# Altium footprint library ALTİUM_PROJE.PcbLib1.PcbLib: 38 footprints (part 1 of 3)
Each footprint in its own frame and in the unit in brackets; x right, y up, seen from the top. Pads: shape width x height; smd on the part's side, far side on the other; paste and mask are expansions set on the pad; w line width, h text height; cw(c..) or ccw(c..) is an arc to the next point about the centre after c.
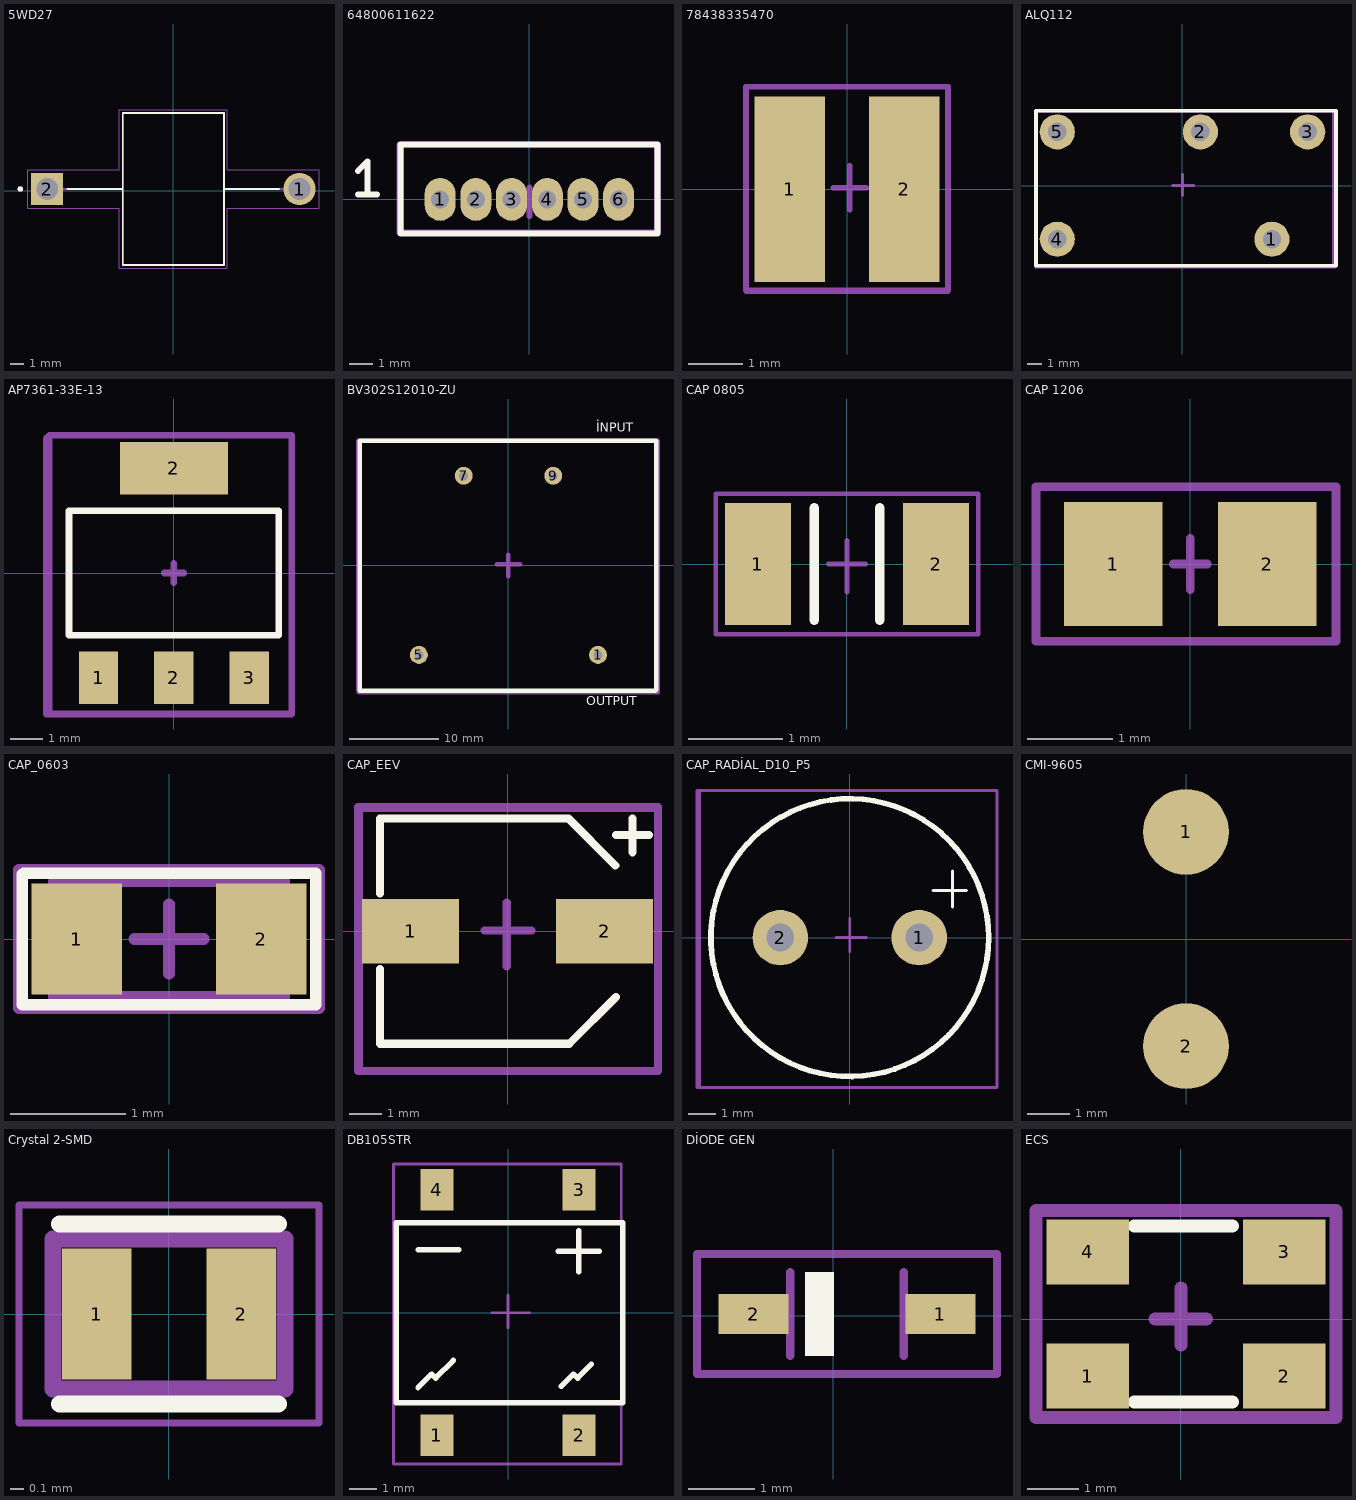
[diagram p0: the footprints below, top view; thin cyan lines are the x and y axes]

## 5WD27 [mm]
pads (2):
  round 2.43 hole 1.62 mask+0.05: 1(9.49,0.127)
  rect 2.43x2.43 hole 1.62: 2(-9.49,0.127)
Top Overlay:
  circle w0.2: c-11.5,0.127 r0.1
  lines w0.127: -7.96,0.127 -3.81,0.127 ; 7.96,0.127 3.81,0.127 ; -3.81,0.127 -3.81,5.847 3.81,5.847 3.81,0.127 ; -3.81,0.127 -3.81,-5.593 3.81,-5.593 3.81,0.127
Mechanical 13:
  circle w0.2: c-11.5,0.127 r0.1
  lines w0.127: -8.275,0.127 -3.81,0.127 ; 8.275,0.127 3.81,0.127 ; -3.81,0.127 -3.81,5.847 3.81,5.847 3.81,0.127 ; -3.81,0.127 -3.81,-5.593 3.81,-5.593 3.81,0.127
Mechanical 15:
  lines w0.05: -10.955,-1.338 -4.06,-1.338 -4.06,-5.843 4.06,-5.843 4.06,-1.338 10.955,-1.338 10.955,1.592 4.06,1.592 4.06,6.097 -4.06,6.097 -4.06,1.592 -10.955,1.592 -10.955,-1.338
3D body "step_temp.STEP": height 5.71, standoff -5.71, extent -31.242,-5.588 26.162,5.842

## 64800611622 [mm]
pads (6):
  oval 1.3x1.8 hole 0.75 mask+0.05: 1(-3.75,0) 2(-2.25,0) 3(-0.75,0) 4(0.75,0) 5(2.25,0) 6(3.75,0)
Top Overlay:
  lines w0.25: -7.2,0.2 -6.4,0.2 ; -7.2,1.2 -6.8,1.6 -6.8,0.2 ; 5.38,2.28 5.38,-1.43 -5.42,-1.43 -5.42,2.3 5.38,2.3
Top Component Center:
  lines w0.25: -0.5,0 0.5,0 ; 0,-0.7 0,0.5 ; -5.45,-1.4 -5.45,2.3 5.35,2.3 5.35,-1.4 -5.45,-1.4
Top Designator:
  lines w0.25: -5.4,-1.4 -5.4,2.3 5.4,2.3 5.4,-1.4 -5.4,-1.4
  text "DESİGNER" at -0.1,1 h1
3D body "64800611622 (rev1).stp": height 5.25, standoff -1.95, extent -5.27,-1.31 5.23,2.19

## 78438335470 [mm]
pads (2):
  rect 1.3x3.4 smd mask+0.05: 1(-1.05,0) 2(1.05,0)
Top Component Center:
  lines w0.1: -0.25,0.025 0.35,0.025 0.05,0.025 ; 0.05,-0.375 0.05,0.025 ; 0.05,0.425 0.05,0.025 ; -1.85,-1.875 -1.85,-0.938 -1.85,0.937 -1.85,1.875 1.85,1.875 1.85,0.937 1.85,-0.938 1.85,-1.875 -1.85,-1.875
Top Designator:
  lines w0.1: -1.854,1.88 -1.854,-1.854 1.854,-1.854 1.854,1.88 -1.829,1.88
  text "DESİGNER" at -0.3,0.6 h0.5
3D body "78438335010_Download_STP_WE-MAIA-3015_rev1.stp": height 1.2, standoff 0, extent -1.5,-1.5 1.5,1.5

## ALQ112 [mm]
pads (5):
  round 2.5 hole 1.3 mask+0.05: 1(6.35,-3.81) 2(1.27,3.81) 3(8.89,3.81) 4(-8.89,-3.81) 5(-8.89,3.81)
Top Overlay:
  lines w0.25: -10.4,-5.7 -10.4,5.3 10.9,5.3 10.9,-5.7 -10.4,-5.7
Top Component Center:
  lines w0.2: -0.7,0 0.8,0 ; 0,-0.7 0,0.8 ; -10.39,-5.79 -10.39,5.31 10.51,5.31 10.81,5.31 10.81,-5.79 -10.39,-5.79
Top Designator:
  lines w0.2: -10.4,-5.8 -10.4,5.3 10.7,5.3 10.7,-5.7 -10.3,-5.7 -10.4,-5.8
  text "DENGİNATOR" at 0.954,-0.046 h1
3D body: height 15.6, standoff 0.4, extent -10.39,-5.69 10.61,5.31
3D body: height 0.45, standoff -3.75, extent 6,-4.06 6.7,-3.56
3D body: height 0.45, standoff -3.75, extent 0.92,3.56 1.62,4.06
3D body: height 0.45, standoff -3.75, extent -9.29,-4.21 -8.49,-3.41
3D body: height 0.45, standoff -3.75, extent -9.29,3.41 -8.49,4.21
3D body: height 0.45, standoff -3.75, extent 8.54,3.56 9.24,4.06

## AP7361-33E-13 [mm]
pads (4):
  rect 1.2x1.6 smd mask+0.05: 1(-2.3,-3.2) 2(0,-3.2) 3(2.3,-3.2)
  rect 3.3x1.6 smd mask+0.05: 2(0,3.2)
Top Overlay:
  lines w0.2: -3.2,-1.9 -3.2,1.9 3.2,1.9 3.2,-1.9 -3.2,-1.9
Top Component Center:
  lines w0.2: -0.3,0 0.3,0 ; 0,-0.3 0,0.3 ; -3.8,-4.3 -3.8,4.2 3.6,4.2 3.6,-4.3 -3.8,-4.3
Top Designator:
  lines w0.2: -3.9,-4.3 -3.9,4.1 -3.8,4.2 3.6,4.2 3.6,-4.3 -3.9,-4.3
3D body "CircuitWorks-SOT-223.step": height 1.65, standoff -0.03, extent -3.25,-3.48 3.25,3.48

## BV302S12010-ZU [mm]
pads (4):
  round 2 hole 1 mask+0.05: 1(10,-10) 5(-10,-10) 7(-5,10) 9(5,10)
Top Overlay:
  lines w0.5: -16.6,-14 -16.6,13.9 16.5,13.9 16.5,-13.9 16.4,-14 -16.6,-14
  text "İNPUT" at 9.8,14.9 h1
  text "OUTPUT" at 8.7,-15.6 h1
Top Component Center:
  lines w0.5: -1.3,0.1 1.3,0.1 ; 0,-1.2 0,1.2 ; -16.8,-14 -16.8,13.9 16.6,13.9 16.6,-13.8 16.6,-14.1 -16.7,-14.1 -16.8,-14
Top Designator:
  lines w0.5: -16.7,-14.2 -16.7,13.8 -16.6,13.9 16.7,13.9 16.7,-14.2 -16.7,-14.2
3D body "User Library-Hahn BV EI 302 2902.SLDPRT": height 4.5, standoff -21.8, extent -16.15,-13.9 16.35,13.6

## CAP 0805 [mm]
pads (2):
  rect 0.7x1.3 smd mask+0.05: 1(-0.95,0) 2(0.95,0)
Top Overlay:
  lines w0.1: -0.35,-0.6 -0.35,0.6 ; 0.35,-0.6 0.35,0.6
Top Component Center:
  lines w0.05: -0.2,0 0.2,0 0,0 ; 0,-0.3 0,0.25 ; -1.4,-0.75 -1.4,0.75 -1.35,0.75 1.4,0.75 1.4,-0.75 -1.4,-0.75
Top Designator:
  lines w0.05: -1.4,-0.75 -1.4,0.75 1.4,0.75 1.4,-0.75 -1.4,-0.75
  text "DESİGNER" at -0.25,0.05 h0.5
3D body "CAPC0805.STEP": height 0.92, standoff 0.02, extent -1.301,-0.678 1.301,0.678

## CAP 1206 [mm]
pads (2):
  rect 1.15x1.45 smd mask+0.05: 1(-0.9,0) 2(0.9,0)
Top Component Center:
  lines w0.1: -0.2,0 0.2,0 0,0 0,0.3 0,-0.3 ; -1.8,-0.9 1.7,-0.9 1.7,0.9 -1.6,0.9 -1.8,0.9 -1.8,-0.9
Top Designator:
  lines w0.1: -1.8,-0.9 -1.8,0.9 1.7,0.9 1.7,-0.9 -1.8,-0.9
  text "DESİGNER" at -0.7,0 h1
3D body "CircuitWorks-CAPACITOR 1206.STEP": height 1.63, standoff -0.03, extent -1.605,-0.78 1.595,0.78

## CAP_0603 [mil]
pads (2):
  rect 31x38 smd mask+1.97: 1(-31.5,0) 2(31.5,0)
Top Overlay:
  lines w3.94: -50.04,22.02 -50.04,-22.48 50.04,-22.48 50.04,22.48 -49.58,22.48
Bottom 3D Body:
  lines w3.94: -39.37,-19.68 39.37,-19.68 39.37,19.68 -39.37,19.68 -39.37,-19.68
  text "DENGİNATOR" at 3.94,-7.87 h9.45
Top Component Center:
  lines w3.94: -11.81,0 11.81,0 ; 0,-11.81 0,11.81 ; -51.18,-23.62 51.18,-23.62 51.18,23.62 -51.18,23.62 -51.18,-23.62
Top Designator:
  lines w3.94: -51.18,-23.62 51.18,-23.62 51.18,23.62 -51.18,23.62 -51.18,-23.62
3D body "CAPC0603.STEP": height 0, standoff -31.5, extent -41.35,-18.28 41.35,22.22

## CAP_EEV [mm]
pads (2):
  rect 3x2 smd mask+0.05: 1(-3,0) 2(3,0)
Top Overlay:
  lines w0.25: -3.937,-1.168 -3.937,-3.48 1.88,-3.48 ; -3.937,1.168 -3.937,3.48 1.88,3.48 3.327,2.032 ; 1.905,-3.48 3.353,-2.032 ; 3.353,2.972 4.369,2.972 ; 3.861,2.438 3.861,3.48
Top Component Center:
  lines w0.25: -0.711,0.025 0.737,0.025 -0.051,0.025 ; -0.025,-1.092 -0.025,0.889 ; -4.623,-4.318 4.648,-4.318 4.648,3.835 -3.861,3.835 -4.623,3.835 -4.623,-4.318
Top Designator:
  lines w0.25: -4.597,-4.318 4.648,-4.318 4.648,-4.293 4.648,3.81 -4.597,3.81 -4.597,-4.318
  text "DESİGNER" at -0.945,1.164 h1.5
3D body "EEV686M035A9HAA.step": height 8.01, standoff 0, extent -3.8,-3.429 3.8,3.371

## CAP_RADİAL_D10_P5 [mm]
pads (2):
  round 2 hole 1 mask+0.05: 1(2.5,0) 2(-2.5,0)
Top Overlay:
  circle w0.2: c0,0 r5
  lines w0.1: 3,1.7 4.2,1.7 ; 3.7,1.1 3.7,2.4
Top Component Center:
  lines w0.1: -0.5,0 0.6,0 ; 0,-0.5 0,0.7 ; -5.5,-5.4 5.3,-5.4 5.3,5.3 -5.5,5.3 -5.5,-5.4
Top Designator:
  lines w0.1: -5.4,-5.4 5.3,-5.4 5.3,5.3 -5.4,5.3 -5.4,-5.4
3D body "ESH477M050AH4AA.step": height 19, standoff -23, extent -5.25,-5.25 5.25,5.25

## CMI-9605 [mm]
pads (2):
  round 2 all layers, no hole mask+0.05: 1(0,2.5) 2(0,-2.5)
3D body: height 0, standoff 0, extent -0.004,-2.532 -0.004,-2.532
3D body: height 0, standoff 0, extent 0,2.483 0,2.483
3D body: height 5, standoff 0, extent -4.4,-4.8 5.2,4.8

## Crystal 2-SMD [mm]
pads (2):
  rect 0.51x0.96 smd mask+0.05: 1(-0.53,0) 2(0.53,0)
Top Overlay:
  lines w0.127: -0.8,-0.66 0.8,-0.66 ; -0.8,0.66 0.8,0.66
Mechanical 13:
  lines w0.127: -0.85,-0.55 -0.85,0.55 0.85,0.55 0.85,-0.55 -0.85,-0.55
Mechanical 15:
  lines w0.05: -1.1,-0.8 -1.1,0.8 1.1,0.8 1.1,-0.8 -1.1,-0.8
3D body "ABS05-32.768KHZ-T--3DModel-STEP-400430.STEP": height 0, standoff -0.5, extent -0.8,-0.5 0.8,0.5

## DB105STR [mm]
pads (4):
  rect 1.2x1.52 smd mask+0.05: 1(-2.605,-4.5) 2(2.605,-4.5) 3(2.605,4.5) 4(-2.605,4.5)
Top Overlay:
  lines w0.2: -3.3,-2.75 -2.8,-2.25 -2.65,-2.4 -2,-1.75 ; -3.3,2.3 -2.925,2.3 -2.175,2.3 -1.8,2.3 ; 1.85,2.25 3.35,2.25 ; 1.95,-2.7 2.4,-2.25 2.55,-2.4 3.05,-1.9 ; 2.6,1.5 2.6,3 ; 4.15,-3.3 -4.1,-3.3 -4.1,3.3 4.2,3.3 4.2,1.675 4.2,-1.575 4.2,-3.3
Top Component Center:
  lines w0.1: -4.2,5.45 -4.2,-5.55 4.15,-5.55 4.15,-5.15 4.15,5.45 2.075,5.45 -2.075,5.45 -4.15,5.45 ; -0.6,0 0.8,0 ; 0,-0.55 0,0.65
Top Designator:
  lines w0.1: -4.2,-5.55 4.15,-5.55 4.15,5.45 -4.2,5.45 -4.2,-5.55
  text "DENGİNATOR" at -0.296,-0.146 h1
3D body "User Library-DB107S  DB-S.step": height 2.66, standoff 0, extent -4.16,-5.15 4.16,5.25

## DİODE GEN [mm]
pads (2):
  rect 1.05x0.6 smd: 1(1.603,0.025) 2(-1.197,0.025)
Top Overlay:
  region: 0.003,-0.6 -0.422,-0.6 -0.422,0.65 0.003,0.65
Mechanical 13:
  lines w0.127: -0.647,-0.6 -0.647,0.65 ; 1.053,-0.6 1.053,0.65
Mechanical 15:
  lines w0.127: -2.047,-0.875 -2.047,0.925 2.453,0.925 2.453,-0.875 -2.047,-0.875
3D body "step_temp.STEP": height 0.9, standoff 0, extent -1.047,-0.6 1.453,0.65

## ECS [mm]
pads (4):
  rect 1.6x1.25 smd mask+0.05: 1(-1.8,-1.1) 2(2,-1.1) 3(2,1.3) 4(-1.8,1.3)
Top Overlay:
  lines w0.25: -0.9,-1.6 1,-1.6 ; -0.9,1.8 1,1.8
Top Component Center:
  lines w0.25: -0.5,0 0.5,0 ; 0,-0.5 0,0.6 ; -2.8,-1.9 3,-1.9 3,2.1 -2.7,2.1 -2.8,2.1 -2.8,-1.9
Top Designator:
  lines w0.25: -2.8,-1.9 3,-1.9 3,2.1 -2.8,2.1 -2.8,-1.9
  text "DESİGNER" at -0.7,0.7 h1
3D body "ECS-160-20-30B-TR.STEP": height 0.85, standoff 0, extent -2.4,-1.5 2.6,1.7